# Altium integrated library EFR_Lib.IntLib: 430 symbols (part 2 of 6)
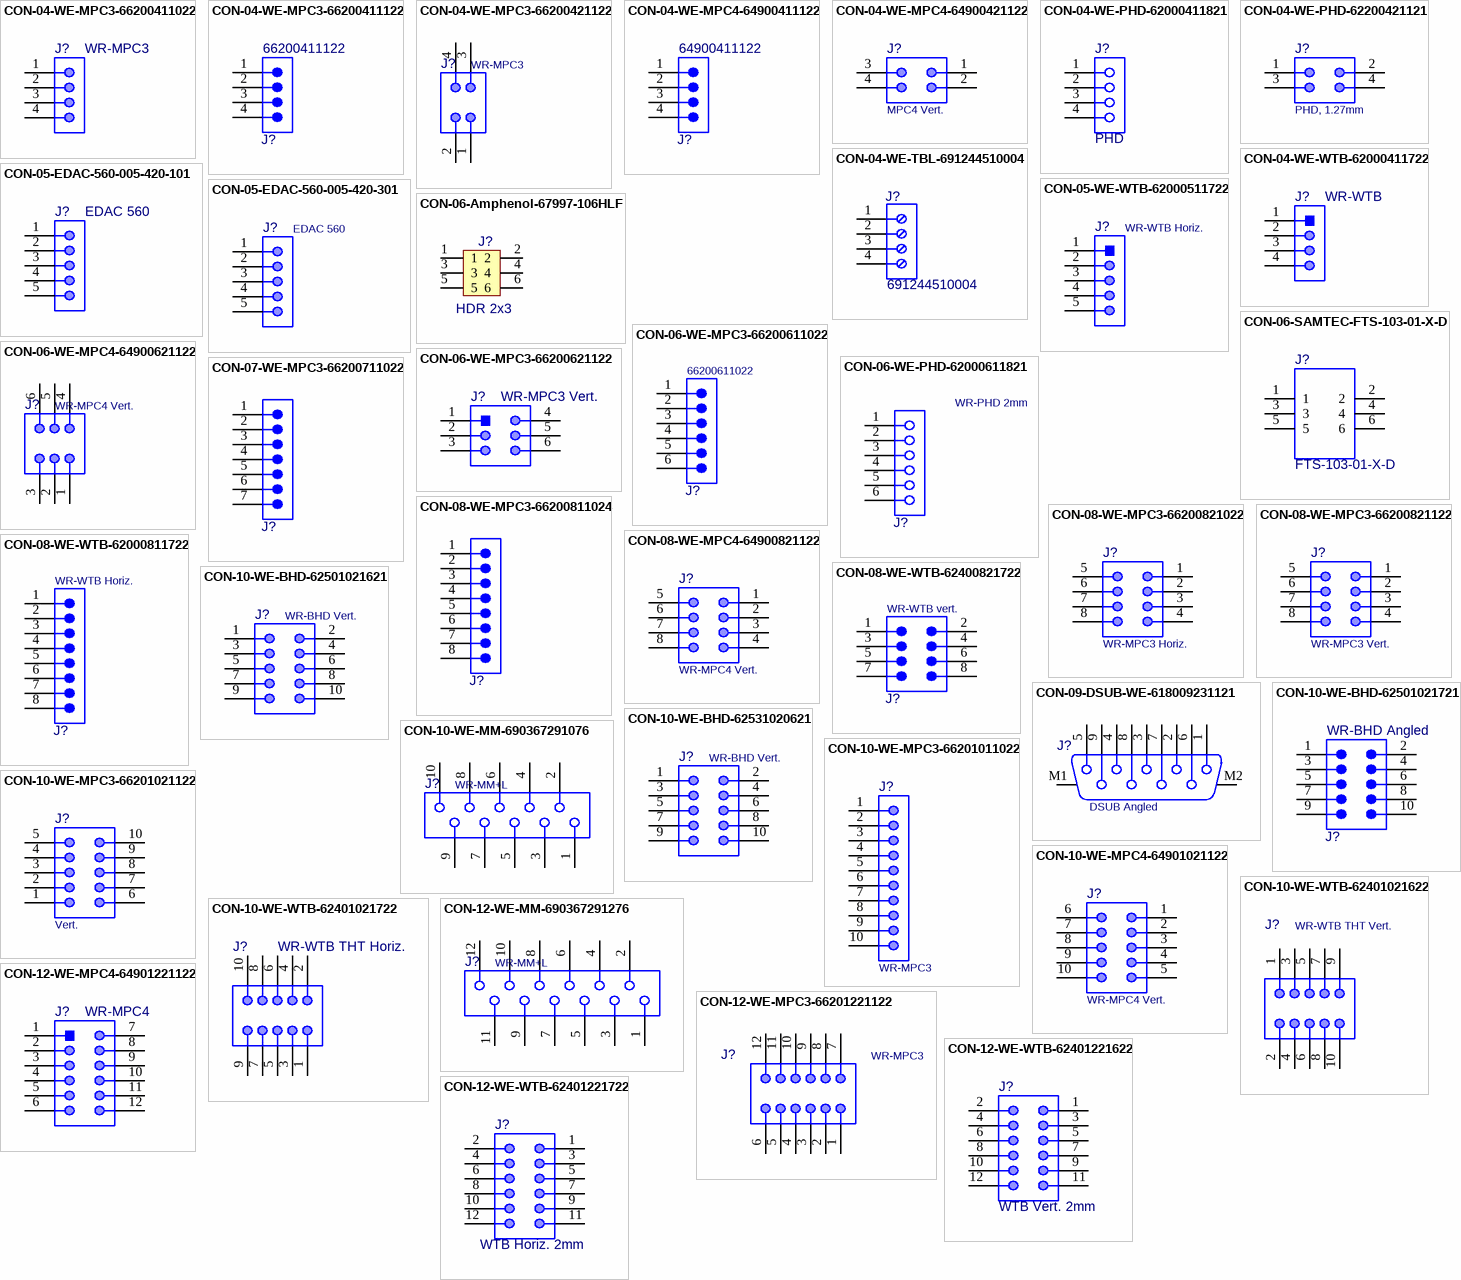
[diagram p30: symbols CON-04-WE-MPC3-66200411022 to CON-12-WE-WTB-62401221722]

## CON-12-WE-WTB-62401221722
designator J?, comment WTB Horiz. 2mm
WR-WTB THT Male Horizontal Shrouded Header with positive locking, Dual Row, pitch 2mm, 12p; Manufacturer: Würth Elektronik; Manufacturer P/N: 62401221722; Pin Number: 12; Contact Resistance: 20mOhm; Rated Current: 3A; Withstanding Voltage: 1000VAC; Working Voltage: 250VAC; ComponentLink1Description: Manufacturer; ComponentLink1URL: https://www.we-online.com/katalog/de/WTB_2_00_MALE_DUAL_ROW_HORIZONTAL_SHROUDED_HEADER_W_POSITIVE_LOCKING_6240XX21722#62401221722; ComponentLink2Description: Datasheet; ComponentLink2URL: https://www.we-online.com/catalog/datasheet/62401221722.pdf; Pitch: 2mm; Mounting Technology: THT; Packaging: Tube; Operating Temperature: -25 to +85degC; Gender: Male; Orientation: Horizontal
footprint CON-12-WE-62401221722 (2.00mm Male Dual Row Horizontal Shrouded Header with positive locking, 12p)
pins: 1, 2, 3, 4, 5, 6, 7, 8, 9, 10, 11, 12

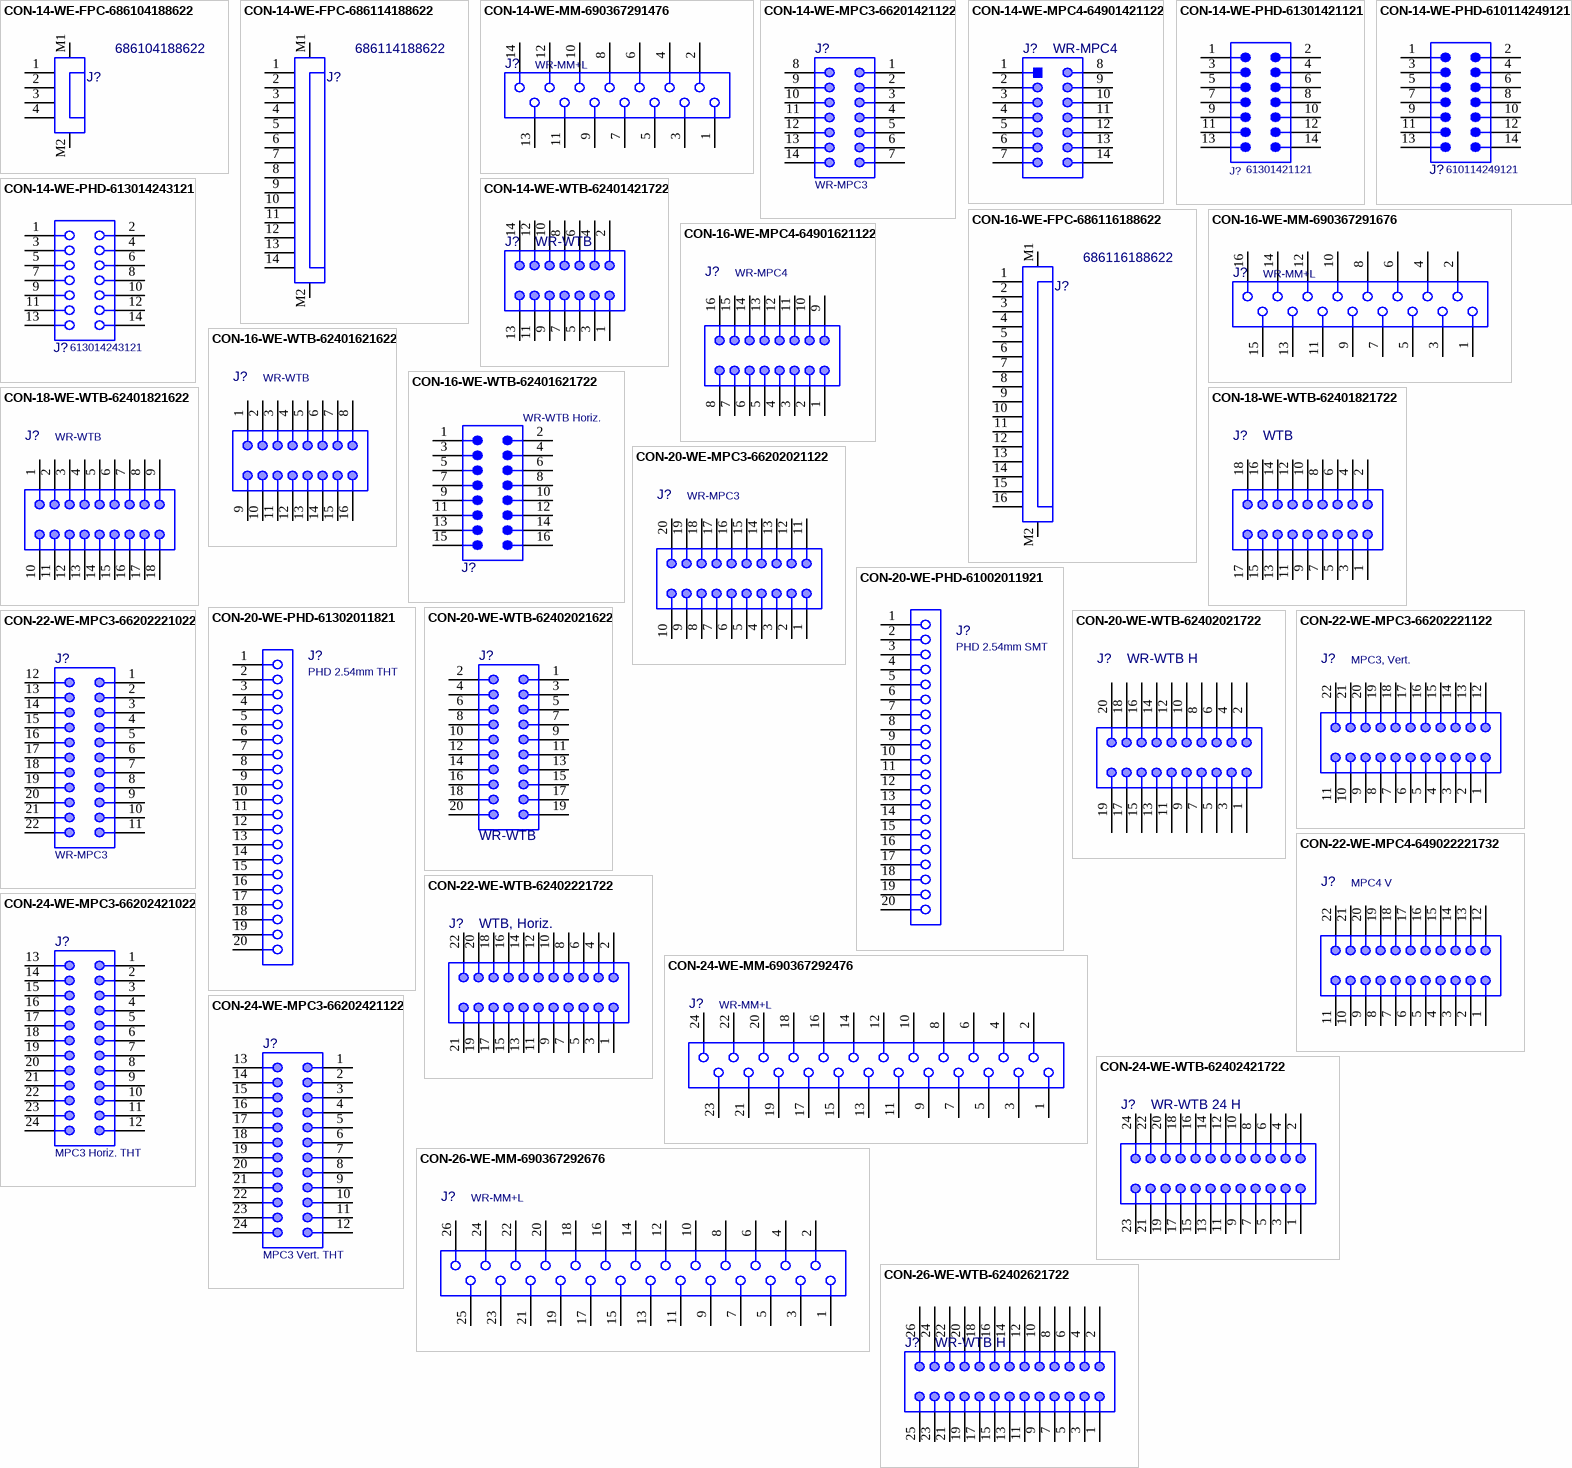
[diagram p5: symbols CON-14-WE-FPC-686104188622 to CON-26-WE-WTB-62402621722]

## CON-14-WE-FPC-686104188622
designator J?, comment 686104188622
WR-FPC SMT LIF Horizontal Top Contact, pitch 1mm, Horizontal, 4pins; Manufacturer: Würth Elektronik; Contact Resistance: 30mΩ; Rated Current: 1A; Working Voltage: 125VAC; ComponentLink1Description: Website Link; ComponentLink1URL: https://www.we-online.com/redexpert/article/686104188622?ad; ComponentLink2Description: Datasheet Link; ComponentLink2URL: https://www.we-online.com/redexpert/spec/686104188622?ad; Manufacturer P/N: 686104188622; Category: FPC Connectors; Match Code: WR-FPC; Mounting Technology: SMT; Operating Temperature Max: 85°C; Operating Temperature Min: -25°C; Packaging: Tape and Reel; Length: 7.8mm; Width: 6.8mm; Height: 3.1mm; Number of Pins: 4; Orientation: Horizontal; Pitch: 1mm
footprint 686104188622
pins: 1, 2, 3, 4, M1, M2

## CON-14-WE-FPC-686114188622
designator J?, comment 686114188622
WR-FPC SMT LIF Horizontal Top Contact, pitch 1mm, Horizontal, 14pins; Manufacturer: Würth Elektronik; Contact Resistance: 30mΩ; Rated Current: 1A; Working Voltage: 125VAC; ComponentLink1Description: Website Link; ComponentLink1URL: https://www.we-online.com/redexpert/article/686114188622?ad; ComponentLink2Description: Datasheet Link; ComponentLink2URL: https://www.we-online.com/redexpert/spec/686114188622?ad; Manufacturer P/N: 686114188622; Category: FPC Connectors; Match Code: WR-FPC; Mounting Technology: SMT; Operating Temperature Max: 85°C; Operating Temperature Min: -25°C; Packaging: Tape and Reel; Length: 17.8mm; Width: 6.8mm; Height: 3.1mm; Number of Pins: 14; Orientation: Horizontal; Pitch: 1mm
footprint 686114188622
pins: 1, 2, 3, 4, 5, 6, 7, 8, 9, 10, 11, 12, 13, 14, M1, M2

## CON-14-WE-MM-690367291476
designator J?, comment WR-MM+L
WR-MM MiniModule Connector, Female, SMT, Vertical, pitch 2.54mm, 14pins; Manufacturer P/N: 690367291476; Manufacturer: Würth Elektronik; PinNumber: 14; Insulation Resistance: >1000MOhm; Rated Current: 1.5A; Working Voltage: 100VAC; Withstanding Voltage: 500VAC; Contact Resistance: 10mOhm; Resistance: 0R010; Current (A): 1.5; Voltage (V): 100; ComponentLink1Description: Manufacturer; ComponentLink1URL: http://www.we-online.de; ComponentLink2Description: Datasheet; ComponentLink2URL: https://katalog.we-online.de/em/datasheet/690367291476.pdf; Published Date: June 2019; Publisher: Wurth Elektronik; Pitch: 2.54mm; Operating Temperature: -40 to +105degC; Mounting Technology: SMT; Packaging: Tape and Reel; Gender: Female; Orientation: Vertical; Capacitance: *; Power (W): *; Value: =PartNumber; Type: *; Tolerance: *
footprint CON-14-WE-690367291476 (MiniModule Connectors, PCB Type, Female, SMT, Vertical, 14p)
pins: 1, 2, 3, 4, 5, 6, 7, 8, 9, 10, 11, 12, 13, 14

## CON-14-WE-MPC3-66201421122
designator J?, comment WR-MPC3
THT Male Header WR-MPC3, Vertical, Dual Row, pitch 3 mm, 14 pins; Manufacturer P/N: 66201421122; Manufacturer: Würth Elektronik; Pitch: 3 mm; Working Voltage: 250 VAC; Contact Resistance: 10 mOhm; Pin Number: 14; ComponentLink1Description: Manufacturer; ComponentLink1URL: http://www.we-online.de; ComponentLink2Description: Datasheet; ComponentLink2URL: https://katalog.we-online.de/em/datasheet/6620xx21122.pdf; Published Date: September 2018; Operating Temperature: -40 to 105 degC; Packaging: Tube; Gender: Male; Mounting Technology: THT; Orientation: Vertical
footprint CON-14-WE-66201421122 (Dual row Vertical header 14p)
pins: 1, 2, 3, 4, 5, 6, 7, 8, 9, 10, 11, 12, 13, 14

## CON-14-WE-MPC4-64901421122
designator J?, comment WR-MPC4
THT Male Header WR-MPC4, Vertical, Dual Row, pitch 4.2 mm, 14 pins; Manufacturer: Würth Elektronik; Manufacturer P/N: 64901421122; PinNumber: 14; Pitch: 4.2mm; Working Voltage: 600VAC; Contact Resistance: 10mOhm; Orientation: Vertical; Mounting Technology: THT; Package Reference: 64901421122; Operating Temperature: -40to105degC; Gender: Male; ComponentLink1Description: Datasheet; ComponentLink1URL: https://katalog.we-online.de/em/datasheet/6490xx21122.pdf; ComponentLink2Description: Manufacturer; ComponentLink2URL: https://www.we-online.com/de/components/products/MPC4_4_20_MALE_DUAL_ROW_VERTICAL_HEADER_6490XX21122?sq=64901421122#64901421122
footprint CON-14-WE-64901421122 (4.20mm Male Dual Row Vertical Header, 14p)
pins: 1, 2, 3, 4, 5, 6, 7, 8, 9, 10, 11, 12, 13, 14

## CON-14-WE-PHD-61301421121
designator J?, comment 61301421121
WR-PHD Pin Header, THT, Vertical, pitch 2.54mm, 2 Row, 14P; Manufacturer: Würth Elektronik; Contact Resistance: 20mΩ; Rated Current: 3A; Working Voltage: 250V; Withstanding Voltage: 500V; ComponentLink1Description: Website Link; ComponentLink1URL: https://www.we-online.com/redexpert/article/61301421121?ad; ComponentLink2Description: Datasheet Link; ComponentLink2URL: https://www.we-online.com/redexpert/spec/61301421121?ad; Manufacturer P/N: 61301421121; Category: Board-to-Board Connectors; Match Code: WR-PHD; Mounting Technology: THT; Operating Temperature Max: 105°C; Operating Temperature Min: -40°C; Packaging: Bag; Gender: Pin Header; Number of Pins: 14; Number of Rows: 2; Orientation: Vertical; Pitch: 2.54mm
footprint 61301421121 (Pin Header, pitch 2.54 mm, THT, Vertical, dual row, 14p)
pins: 1, 2, 3, 4, 5, 6, 7, 8, 9, 10, 11, 12, 13, 14

## CON-14-WE-PHD-610114249121
designator J?, comment 610114249121
WR-PHD Pin Header, SMT, Angled, pitch 2.54mm, 2 Row, 14P; Manufacturer: Würth Elektronik; Contact Resistance: 20mΩ; Rated Current: 3A; Working Voltage: 250V; Withstanding Voltage: 600V; ComponentLink1Description: Website Link; ComponentLink1URL: https://www.we-online.com/redexpert/article/610114249121?ad; ComponentLink2Description: Datasheet Link; ComponentLink2URL: https://www.we-online.com/redexpert/spec/610114249121?ad; Manufacturer P/N: 610114249121; Category: Board-to-Board Connectors; Match Code: WR-PHD; Mounting Technology: SMT; Operating Temperature Max: 105°C; Operating Temperature Min: -40°C; Packaging: Tape and Reel; Gender: Pin Header; Number of Pins: 14; Number of Rows: 2; Orientation: Angled; Pitch: 2.54mm
footprint 610114249121
pins: 1, 2, 3, 4, 5, 6, 7, 8, 9, 10, 11, 12, 13, 14

## CON-14-WE-PHD-613014243121
designator J?, comment 613014243121
WR-PHD Socket Header, THT, Angled, pitch 2.54mm, 2 Row, 14P; Manufacturer: Würth Elektronik; Contact Resistance: 20mΩ; Rated Current: 3A; Working Voltage: 250V; Withstanding Voltage: 500V; ComponentLink1Description: Website Link; ComponentLink1URL: https://www.we-online.com/redexpert/article/613014243121?ad; ComponentLink2Description: Datasheet Link; ComponentLink2URL: https://www.we-online.com/redexpert/spec/613014243121?ad; Manufacturer P/N: 613014243121; Category: Board-to-Board Connectors; Match Code: WR-PHD; Mounting Technology: THT; Operating Temperature Max: 125°C; Operating Temperature Min: -40°C; Packaging: Tray; Gender: Socket Header; Number of Pins: 14; Number of Rows: 2; Orientation: Angled; Pitch: 2.54mm
footprint 613014243121
pins: 1, 2, 3, 4, 5, 6, 7, 8, 9, 10, 11, 12, 13, 14

## CON-14-WE-WTB-62401421722
designator J?, comment WR-WTB
WR-WTB THT Male Horizontal Shrouded Header with positive locking, Dual Row, pitch 2mm, 14p; Manufacturer: Würth Elektronik; Manufacturer P/N: 62401421722; Pin Number: 14; Contact Resistance: 20mOhm; Rated Current: 3A; Withstanding Voltage: 1000VAC; Working Voltage: 250VAC; ComponentLink1Description: Manufacturer; ComponentLink1URL: http://www.we-online.de; ComponentLink2Description: Datasheet; ComponentLink2URL: https://www.we-online.com/catalog/datasheet/62401421722.pdf; Pitch: 2mm; Published Date: January 2020; Mounting Technology: THT; Packaging: Tube; Operating Temperature: -25 to +85degC; Gender: Male; Orientation: Horizontal
footprint CON-14-WE-62401421722 (2.00mm Male Dual Row Horizontal Shrouded Header with positive locking, 14p)
pins: 1, 2, 3, 4, 5, 6, 7, 8, 9, 10, 11, 12, 13, 14

## CON-16-WE-FPC-686116188622
designator J?, comment 686116188622
WR-FPC SMT LIF Horizontal Top Contact, pitch 1mm, Horizontal, 16pins; Manufacturer: Würth Elektronik; Contact Resistance: 30mΩ; Rated Current: 1A; Working Voltage: 125VAC; ComponentLink1Description: Website Link; ComponentLink1URL: https://www.we-online.com/redexpert/article/686116188622?ad; ComponentLink2Description: Datasheet Link; ComponentLink2URL: https://www.we-online.com/redexpert/spec/686116188622?ad; Manufacturer P/N: 686116188622; Category: FPC Connectors; Match Code: WR-FPC; Mounting Technology: SMT; Operating Temperature Max: 85°C; Operating Temperature Min: -25°C; Packaging: Tape and Reel; Length: 19.8mm; Width: 6.8mm; Height: 3.1mm; Number of Pins: 16; Orientation: Horizontal; Pitch: 1mm
footprint 686116188622
pins: 1, 2, 3, 4, 5, 6, 7, 8, 9, 10, 11, 12, 13, 14, 15, 16, M1, M2

## CON-16-WE-MM-690367291676
designator J?, comment WR-MM+L
WR-MM MiniModule Connector, Female, SMT, Vertical, pitch 2.54mm, 16pins; Manufacturer P/N: 690367291676; Manufacturer: Würth Elektronik; PinNumber: 16; Insulation Resistance: >1000MOhm; Rated Current: 1.5A; Working Voltage: 100VAC; Withstanding Voltage: 500VAC; Contact Resistance: 10mOhm; Current (A): 1.5; Resistance: 0R010; Voltage (V): 100; ComponentLink1Description: Manufacturer; ComponentLink1URL: http://www.we-online.de; ComponentLink2Description: Datasheet; ComponentLink2URL: https://katalog.we-online.de/em/datasheet/690367291676.pdf; Published Date: June 2019; Publisher: Wurth Elektronik; Pitch: 2.54mm; Operating Temperature: -40 to +105degC; Mounting Technology: SMT; Packaging: Tape and Reel; Gender: Female; Orientation: Vertical; Type: *; Tolerance: *; Power (W): *; Capacitance: *; Value: =PartNumber
footprint CON-16-WE-690367291676 (MiniModule Connectors, PCB Type, Female, SMT, Vertical, 16p)
pins: 1, 2, 3, 4, 5, 6, 7, 8, 9, 10, 11, 12, 13, 14, 15, 16

## CON-16-WE-MPC4-64901621122
designator J?, comment WR-MPC4
THT Male Header WR-MPC4, Vertical, Dual Row, pitch 4.2 mm, 16 pins; Manufacturer P/N: 64901621122; Manufacturer: Würth Elektronik; Pitch: 4.2 mm; Working Voltage: 600 VAC; Contact Resistance: 10 mOhm; PinNumber: 16; ComponentLink1Description: Manufacturer; ComponentLink1URL: http://www.we-online.de; ComponentLink2Description: Datasheet; ComponentLink2URL: https://katalog.we-online.de/em/datasheet/6490xx21122.pdf; Published Date: September 2018; Operating Temperature: -40 to 105 degC; Packaging: Tray; Gender: Male; Mounting Technology: THT; Orientation: Vertical; Value: *; Current (A): *; Voltage (V): *; Power (W): *; Tolerance: *; Capacitance: *; Resistance: *
footprint CON-16-WE-64901621122 (4.20mm Male Dual Row Vertical Header, 16p)
pins: 1, 2, 3, 4, 5, 6, 7, 8, 9, 10, 11, 12, 13, 14, 15, 16

## CON-16-WE-WTB-62401621622
designator J?, comment WR-WTB
Male Shrouded Header WR-WTB, THT, Vertical, pitch 2 mm, 2 x 8 position; Manufacturer P/N: 62401621622; Manufacturer: Würth Elektronik; Pitch: 2 mm; Working Voltage: 250 VAC; Contact Resistance: 20 mOhm; Position: 2 x 8; ComponentLink1Description: Manufacturer; ComponentLink1URL: http://www.we-online.de; ComponentLink2Description: Datasheet; ComponentLink2URL: https://katalog.we-online.de/em/datasheet/6240xx21622.pdf; Published Date: September 2018; Operating Temperature: -25 to 85 degC; Packaging: Tube; Gender: Male; Mounting Technology: THT; Orientation: Vertical; Current (A): *; Voltage (V): *; Tolerance: *; Power (W): *; Capacitance: *; Resistance: *; Value: *; Typ: *
footprint CON-16-WE-62401621622 (2.00mm Male Dual Row Vertical Shrouded Header with positive locking, 16p)
pins: 1, 2, 3, 4, 5, 6, 7, 8, 9, 10, 11, 12, 13, 14, 15, 16

## CON-16-WE-WTB-62401621722
designator J?, comment WR-WTB Horiz.
WR-WTB THT Male Horizontal Shrouded Header with positive locking, Dual Row, pitch 2mm, 16pins; Manufacturer P/N: 62401621722; Manufacturer: Würth Elektronik; Contact Resistance: 20mOhm; Rated Current: 3A; Working Voltage: 250VAC; Withstanding Voltage: 1000VAC; ComponentLink1Description: Website Link; ComponentLink1URL: https://www.we-online.com/redexpert/article/62401621722?ad; ComponentLink2Description: Datasheet Link; ComponentLink2URL: https://www.we-online.com/redexpert/spec/62401621722?ad; Category: Wire-to-Board Connectors; Match Code: WR-WTB; Mounting Technology: THT; Operating Temperature Max: 85°C; Operating Temperature Min: -25°C; Packaging: Tube; Length: 19.4mm; Width: 14.5mm; Height: 11.7mm; Gender: Male; Number of Pins: 16; Number of Rows: 2; Orientation: Horizontal; Pitch: 2mm
footprint 62401621722 (2.00mm Male Dual Row Horizontal Shrouded Header with positive locking, 16p)
pins: 1, 2, 3, 4, 5, 6, 7, 8, 9, 10, 11, 12, 13, 14, 15, 16

## CON-18-WE-WTB-62401821622
designator J?, comment WR-WTB
Male Shrouded Header WR-WTB, THT, Vertical, pitch 2 mm, 2 x 9 position; Manufacturer P/N: 62401821622; Manufacturer: Würth Elektronik; Pitch: 2 mm; Working Voltage: 250 VAC; Contact Resistance: 20 mOhm; PinNumber: 2 x 9; ComponentLink1Description: Manufacturer; ComponentLink1URL: http://www.we-online.de; ComponentLink2Description: Datasheet; ComponentLink2URL: https://katalog.we-online.de/em/datasheet/6240xx21622.pdf; Published Date: September 2018; Operating Temperature: -25 to 85 degC; Packaging: Tube; Gender: Male; Mounting Technology: THT; Orientation: Vertical; Current (A): *; Voltage (V): *; Power (W): *; Typ: *; Value: *; Capacitance: *; Resistance: *; Tolerance: *
footprint CON-18-WE-62401821622 (2.00mm Male Dual Row Vertical Shrouded Header with positive locking, 18p)
pins: 1, 2, 3, 4, 5, 6, 7, 8, 9, 10, 11, 12, 13, 14, 15, 16, 17, 18

## CON-18-WE-WTB-62401821722
designator J?, comment WTB
WR-WTB THT Male Horizontal Shrouded Header with positive locking, Dual Row, pitch 2mm, 18p; Manufacturer: Würth Elektronik; Manufacturer P/N: 62401821722; Pin Number: 18; Contact Resistance: 20mOhm; Rated Current: 3A; Withstanding Voltage: 1000VAC; Working Voltage: 250VAC; ComponentLink1Description: Manufacturer; ComponentLink1URL: http://www.we-online.de; ComponentLink2Description: Datasheet; ComponentLink2URL: https://www.we-online.com/catalog/datasheet/62401821722.pdf; Pitch: 2mm; Published Date: January 2020; Mounting Technology: THT; Packaging: Tube; Operating Temperature: -25 to +85degC; Gender: Male; Orientation: Horizontal
footprint CON-18-WE-62401821722 (2.00mm Male Dual Row Horizontal Shrouded Header with positive locking, 18p)
pins: 1, 2, 3, 4, 5, 6, 7, 8, 9, 10, 11, 12, 13, 14, 15, 16, 17, 18

## CON-20-WE-MPC3-66202021122
designator J?, comment WR-MPC3
THT Male Header WR-MPC3, Vertical, Dual Row, pitch 3 mm, 20 pins; Manufacturer P/N: 66202021122; Manufacturer: Würth Elektronik; Pitch: 3 mm; Working Voltage: 250 VAC; Contact Resistance: 10 mOhm; PinNumber: 20; ComponentLink1Description: Manufacturer; ComponentLink1URL: http://www.we-online.de; ComponentLink2Description: Datasheet; ComponentLink2URL: https://katalog.we-online.de/em/datasheet/6620xx21122.pdf; Published Date: September 2018; Operating Temperature: -40 to 105 degC; Packaging: Tube; Gender: Male; Mounting Technology: THT; Orientation: Vertical
footprint CON-20-WE-66202021122 (Dual row Vertical header 20p)
pins: 1, 2, 3, 4, 5, 6, 7, 8, 9, 10, 11, 12, 13, 14, 15, 16, 17, 18, 19, 20

## CON-20-WE-PHD-61002011921
designator J?, comment PHD 2.54mm SMT
WR-PHD Socket Header, SMT, pitch 2.54mm, Single Row, Vertical, 20pin; Manufacturer P/N: 61002011921; Manufacturer: Würth Elektronik; PinNumber: 20; Gender: Female; Rated Current: 3A; Working Voltage: 250VAC; Withstanding Voltage: 500VAC; Contact Resistance: 20mOhm; ComponentLink1Description: Manufacturer; ComponentLink1URL: http://www.we-online.de; ComponentLink2Description: Datasheet; ComponentLink2URL: https://katalog.we-online.de/em/datasheet/6100xx11921.pdf; Published Date: June 2019; Pitch: 2.54mm; Operating Temperature: -40 to +125degC; Mounting Technology: SMT; Packaging: Tube; Row Number: Single; Orientation: Vertical
footprint CON-20-WE-61002011921 (Socket Header, Pitch 2.54 mm, SMT, Vertical, single row, 20p)
pins: 1, 2, 3, 4, 5, 6, 7, 8, 9, 10, 11, 12, 13, 14, 15, 16, 17, 18, 19, 20

## CON-20-WE-PHD-61302011821
designator J?, comment PHD 2.54mm THT
WR-PHD Socket Header, THT, pitch 2.54mm, Single Row, Vertical, 20pin; Manufacturer P/N: 61302011821; Manufacturer: Würth Elektronik; Pin Number: 20; Gender: Female; Rated Current: 3A; Working Voltage: 250VAC; Withstanding Voltage: 500VAC; Contact Resistance: 20mOhm; ComponentLink1Description: Manufacturer; ComponentLink1URL: http://www.we-online.de; ComponentLink2Description: Datasheet; ComponentLink2URL: https://katalog.we-online.de/em/datasheet/6130xx11821.pdf; Published Date: June 2019; Pitch: 2.54mm; Operating Temperature: -40 to +125degC; Mounting Technology: THT; Packaging: Tray; Row Number: Single; Orientation: Vertical
footprint CON-20-WE-61302011821 (Socket Header, Pitch 2.54 mm, THT, Vertical, single row, 20p)
pins: 1, 2, 3, 4, 5, 6, 7, 8, 9, 10, 11, 12, 13, 14, 15, 16, 17, 18, 19, 20

## CON-20-WE-WTB-62402021622
designator J?, comment WR-WTB
WR-WTB THT Male Vertical Shrouded Header with positive locking, Dual Row, pitch 2mm, 20p; Manufacturer: Würth Elektronik; Manufacturer P/N: 62402021622; Pin Number: 20; Contact Resistance: 20mOhm; Rated Current: 3A; Withstanding Voltage: 1000VAC; Working Voltage: 250VAC; ComponentLink1Description: Manufacturer; ComponentLink1URL: http://www.we-online.de; ComponentLink2Description: Datasheet; ComponentLink2URL: https://www.we-online.com/catalog/datasheet/62402021622.pdf; Pitch: 2mm; Published Date: January 2020; Mounting Technology: THT; Packaging: Tube; Operating Temperature: -25 to +85degC; Gender: Male; Type: Vertical
footprint CON-20-WE-62402021622 (2.00mm Male Dual Row Vertical Shrouded Header with positive locking, 20p)
pins: 1, 2, 3, 4, 5, 6, 7, 8, 9, 10, 11, 12, 13, 14, 15, 16, 17, 18, 19, 20

## CON-20-WE-WTB-62402021722
designator J?, comment WR-WTB H
WR-WTB THT Male Horizontal Shrouded Header with positive locking, Dual Row, pitch 2mm, 20p; Manufacturer: Würth Elektronik; Manufacturer P/N: 62402021722; Pin Number: 20; Contact Resistance: 20mOhm; Rated Current: 3A; Withstanding Voltage: 1000VAC; Working Voltage: 250VAC; ComponentLink1Description: Manufacturer; ComponentLink1URL: http://www.we-online.de; ComponentLink2Description: Datasheet; ComponentLink2URL: https://www.we-online.com/catalog/datasheet/62402021722.pdf; Pitch: 2mm; Published Date: January 2020; Mounting Technology: THT; Packaging: Tube; Operating Temperature: -25 to +85degC; Gender: Male; Orientation: Horizontal
footprint CON-20-WE-62402021722 (2.00mm Male Dual Row Horizontal Shrouded Header with positive locking, 20p)
pins: 1, 2, 3, 4, 5, 6, 7, 8, 9, 10, 11, 12, 13, 14, 15, 16, 17, 18, 19, 20

## CON-22-WE-MPC3-66202221022
designator J?, comment WR-MPC3
THT Male Header WR-MPC3, with Snap-in Plastic Pegs, Right Angled, Dual Row, pitch 3 mm, 22 pins; Manufacturer P/N: 66202221022; Manufacturer: Würth Elektronik; Pitch: 3 mm; Working Voltage: 250 VAC; Contact Resistance: 10 mOhm; Pin Number: 22; ComponentLink1Description: Manufacturer; ComponentLink1URL: http://www.we-online.de; ComponentLink2Description: Datasheet; ComponentLink2URL: https://katalog.we-online.de/em/datasheet/6620xx21022.pdf; Published Date: September 2018; Operating Temperature: -40 to 105 degC; Packaging: Tube; Gender: Male; Mounting Technology: THT; Orientation: Right Angled
footprint CON-22-WE-66202221022 (Dual row Right angle header With plastic peg 22p)
pins: 1, 2, 3, 4, 5, 6, 7, 8, 9, 10, 11, 12, 13, 14, 15, 16, 17, 18, 19, 20, 21, 22

## CON-22-WE-MPC3-66202221122
designator J?, comment MPC3, Vert.